# Altium schematic symbol library TI - ADC.SchLib: 2197 symbols (part 55 of 130) (continued)
## ADS7842E (continued)

## ADS7842E/1K
designator U?
12-Bit, 4-Channel Parallel Output Sampling ADC, -40 to 85 degC, 28-pin SOP (DB28), Green (RoHS & no Sb/Br); Manufacturer: Texas Instruments; PartNumber: ADS7842E/1K; # Input Channels: 4; Analog Voltage AV/DD(Max)(V): 5.25; Analog Voltage AV/DD(Min)(V): 2.7; Architecture: SAR; INL(Max)(+/-LSB): 2; Interface: Parallel CMOS; Resolution(Bits): 12; Sample Rate (max)(SPS): 200k; SFDR(dB): 79; SINAD(dB): 71; SNR(dB): 72; SubFamily: Precision ADC (<=10MSPS); DatasheetVersion: SBAS103C; PackageVersion: 4040065/E, 12/2001; PackageReference: DB28; PackageDescription: 28-Pin Plastic Small Outline, Body 10.2 X 5.3 mm, Pitch 0.65 mm; Supplier 1: Digi-Key; Supplier Part Number 1: 296-2204-5-ND; Supplier 2: Newark; Supplier Part Number 2: 19C9007; Supplier 3: Mouser; Supplier Part Number 3: 595-TLV2548CDW; Digital Supply(Max)(V): 5.25; Digital Supply(Min)(V): 2.7; Eco-Plan: Green (RoHS & no Sb/Br); Mounting Technology: Surface Mount; Code_JEDEC: MO-150; ComponentLink1Description: Manufacturer URL; ComponentLink1URL: http://www.ti.com/; ComponentLink2Description: Datasheet; ComponentLink2URL: http://www.ti.com/general/docs/lit/getliterature.tsp?genericPartNumber=ADS7842&fileType=pdf; ComponentLink3Description: Package Specification; ComponentLink3URL: http://www.ti.com/lit/ml/msso002e/msso002e.pdf
footprint TI-DB28_N (SOP, 28-Leads, Body 10.2x5.3mm, Pitch 0.65mm, IPC Medium Density)
footprint TI-DB28_L (SOP, 28-Leads, Body 10.2x5.3mm, Pitch 0.65mm, IPC High Density)
footprint TI-DB28_M (SOP, 28-Leads, Body 10.2x5.3mm, Pitch 0.65mm, IPC Low Density)
pins: 1 AIN0 (in) "Analog Input Channel 0", 2 AIN1 (in) "Analog Input Channel 1", 3 AIN2 (in) "Analog Input Channel 2", 4 AIN3 (in) "Analog Input Channel 3", 5 VREF (in) "Voltage Reference Input. See Electrical Characteristics Tables for ranges.", 6 AGND (power) "Analog Ground", 7 DB11 (hiz) "Data Bit 11 (MSB)", 8 DB10 (hiz) "Data Bit 10", 9 DB9 (hiz) "Data Bit 9", 10 DB8 (hiz) "Data Bit 8", 11 DB7 (hiz) "Data Bit 7", 12 DB6 (hiz) "Data Bit 6", 13 DB5 (hiz) "Data Bit 5", 14 DGND (power) "Digital Ground", 15 DB4 (hiz) "Data Bit 4", 16 DB3 (hiz) "Data Bit 3", 17 DB2 (hiz) "Data Bit 2", 18 DB1 (hiz) "Data Bit 1", 19 DB0 (hiz) "Data Bit 0 (LSB)", 20 ~{RD} (in) "Read Input. Active LOW. Reads the data outputs in combination with C\S\.", 21 ~{CS} (in) "Chip Select Input. Active LOW. The combination of C\S\ taken LOW and W\R\ taken LOW initiates a new conversion and places the outputs in the tri-state mode.", 22 ~{WR} (in) "Write Input. Active LOW. Starts a new conversion and selects an analog channel via address inputs A0 and A1, in combination with C\S\.", 23 ~{BUSY} (out) "B\U\S\Y\ goes LOW and stays LOW during a conversion. B\U\S\Y\ rises when a conversion is complete and enables the parallel outputs.", 24 CLK (in) "External Clock Input. The clock speed determines the conversion rate by the equation fCLK = 16 • fSAMPLE.", 25 A0 (in) "Address Inputs. Selects one of four analog input channels in combination with C\S\ and W\R\. The address inputs are latched on the rising edge of either R\D\ or W\R\.", 26 A1 (in) "Address Inputs. Selects one of four analog input channels in combination with C\S\ and W\R\. The address inputs are latched on the rising edge of either R\D\ or W\R\.", 27 VDIG (power) "Digital Supply Input. Nominally +5V.", 28 VANA (power) "Analog Supply Input. Nominally +5V."

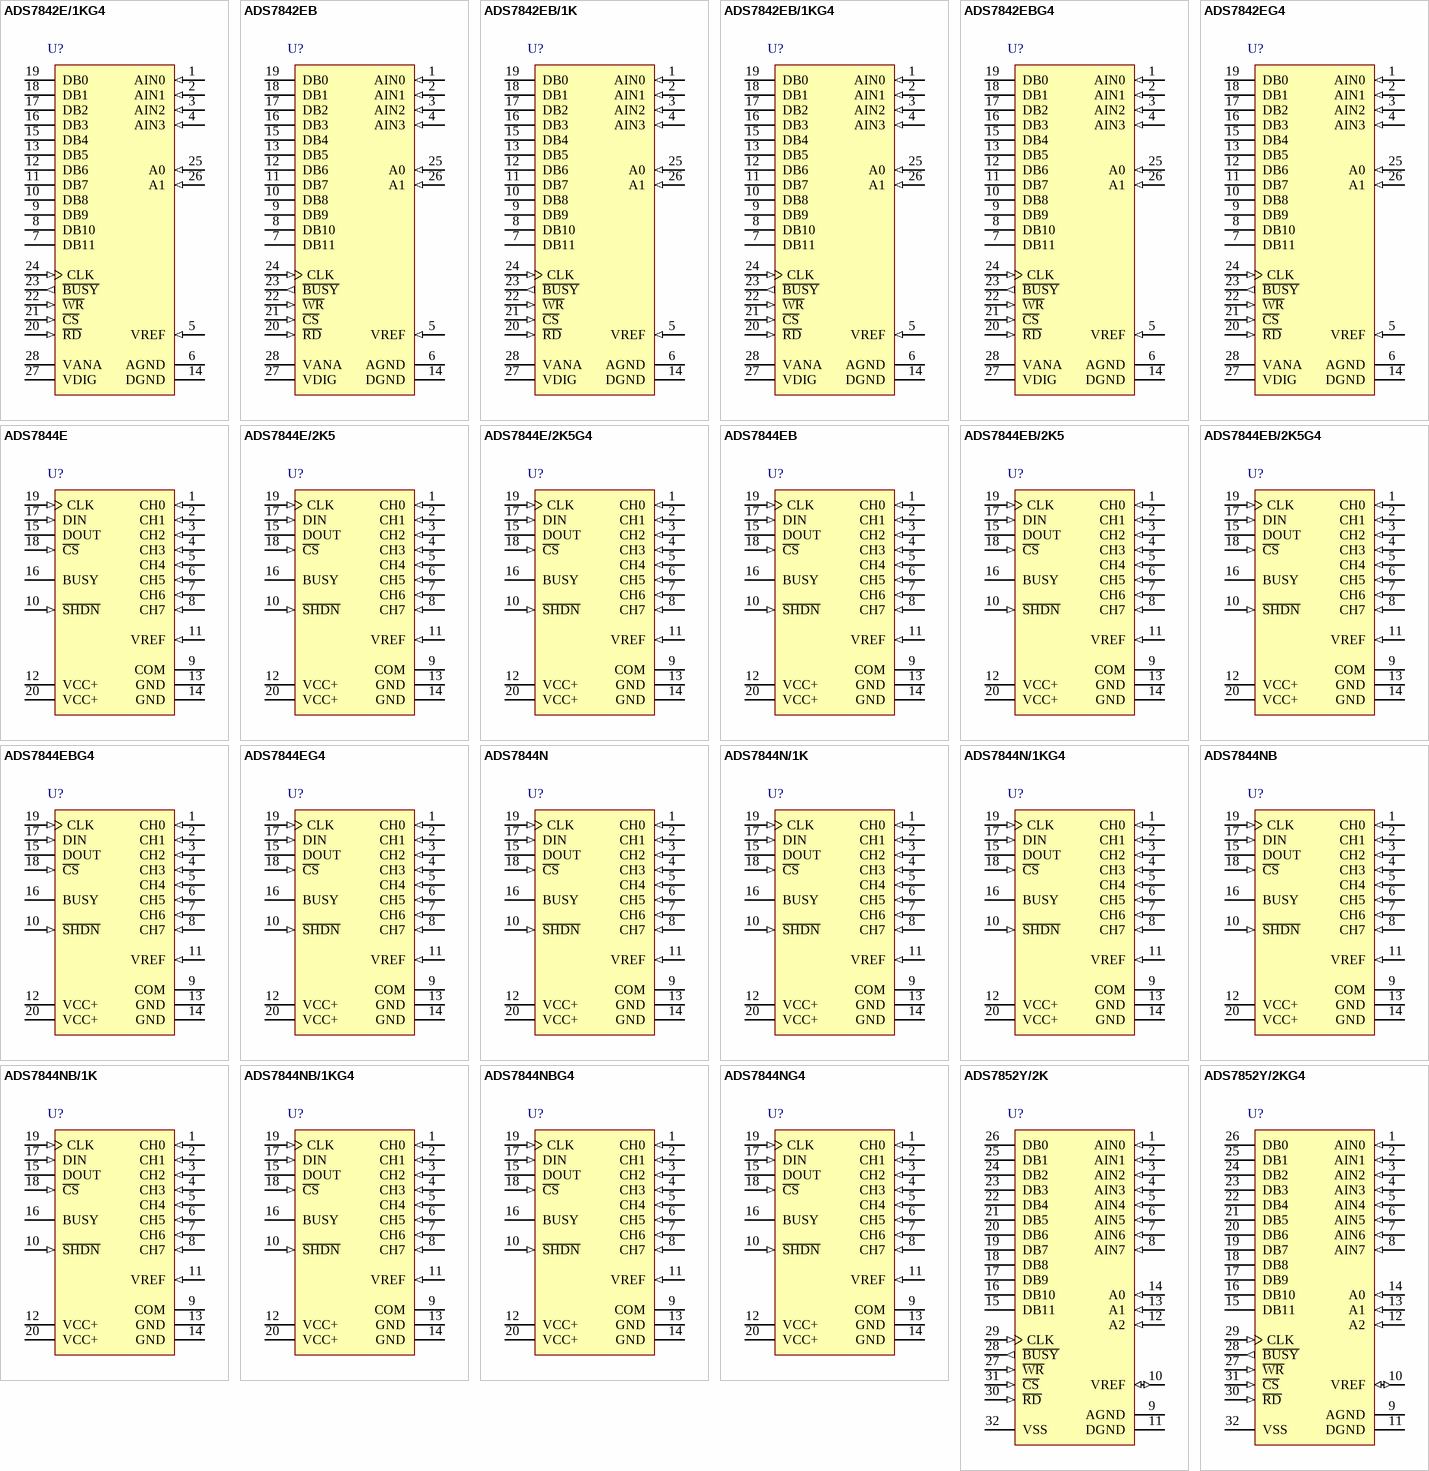
[diagram p65: symbols ADS7842E/1KG4 to ADS7852Y/2KG4]

## ADS7842E/1KG4
designator U?
12-Bit, 4-Channel Parallel Output Sampling ADC, -40 to 85 degC, 28-pin SOP (DB28), Green (RoHS & no Sb/Br); Manufacturer: Texas Instruments; PartNumber: ADS7842E/1KG4; # Input Channels: 4; Analog Voltage AV/DD(Max)(V): 5.25; Analog Voltage AV/DD(Min)(V): 2.7; Architecture: SAR; INL(Max)(+/-LSB): 2; Interface: Parallel CMOS; Resolution(Bits): 12; Sample Rate (max)(SPS): 200k; SFDR(dB): 79; SINAD(dB): 71; SNR(dB): 72; SubFamily: Precision ADC (<=10MSPS); DatasheetVersion: SBAS103C; PackageVersion: 4040065/E, 12/2001; PackageReference: DB28; PackageDescription: 28-Pin Plastic Small Outline, Body 10.2 X 5.3 mm, Pitch 0.65 mm; Supplier 1: Digi-Key; Supplier Part Number 1: TLV2548CDWG4-ND; Supplier 2: Mouser; Supplier Part Number 2: 595-TLV2548CDWG4; Digital Supply(Max)(V): 5.25; Digital Supply(Min)(V): 2.7; Eco-Plan: Green (RoHS & no Sb/Br); Mounting Technology: Surface Mount; Code_JEDEC: MO-150; ComponentLink1Description: Manufacturer URL; ComponentLink1URL: http://www.ti.com/; ComponentLink2Description: Datasheet; ComponentLink2URL: http://www.ti.com/general/docs/lit/getliterature.tsp?genericPartNumber=ADS7842&fileType=pdf; ComponentLink3Description: Package Specification; ComponentLink3URL: http://www.ti.com/lit/ml/msso002e/msso002e.pdf
footprint TI-DB28_N (SOP, 28-Leads, Body 10.2x5.3mm, Pitch 0.65mm, IPC Medium Density)
footprint TI-DB28_L (SOP, 28-Leads, Body 10.2x5.3mm, Pitch 0.65mm, IPC High Density)
footprint TI-DB28_M (SOP, 28-Leads, Body 10.2x5.3mm, Pitch 0.65mm, IPC Low Density)
pins: 1 AIN0 (in) "Analog Input Channel 0", 2 AIN1 (in) "Analog Input Channel 1", 3 AIN2 (in) "Analog Input Channel 2", 4 AIN3 (in) "Analog Input Channel 3", 5 VREF (in) "Voltage Reference Input. See Electrical Characteristics Tables for ranges.", 6 AGND (power) "Analog Ground", 7 DB11 (hiz) "Data Bit 11 (MSB)", 8 DB10 (hiz) "Data Bit 10", 9 DB9 (hiz) "Data Bit 9", 10 DB8 (hiz) "Data Bit 8", 11 DB7 (hiz) "Data Bit 7", 12 DB6 (hiz) "Data Bit 6", 13 DB5 (hiz) "Data Bit 5", 14 DGND (power) "Digital Ground", 15 DB4 (hiz) "Data Bit 4", 16 DB3 (hiz) "Data Bit 3", 17 DB2 (hiz) "Data Bit 2", 18 DB1 (hiz) "Data Bit 1", 19 DB0 (hiz) "Data Bit 0 (LSB)", 20 ~{RD} (in) "Read Input. Active LOW. Reads the data outputs in combination with C\S\.", 21 ~{CS} (in) "Chip Select Input. Active LOW. The combination of C\S\ taken LOW and W\R\ taken LOW initiates a new conversion and places the outputs in the tri-state mode.", 22 ~{WR} (in) "Write Input. Active LOW. Starts a new conversion and selects an analog channel via address inputs A0 and A1, in combination with C\S\.", 23 ~{BUSY} (out) "B\U\S\Y\ goes LOW and stays LOW during a conversion. B\U\S\Y\ rises when a conversion is complete and enables the parallel outputs.", 24 CLK (in) "External Clock Input. The clock speed determines the conversion rate by the equation fCLK = 16 • fSAMPLE.", 25 A0 (in) "Address Inputs. Selects one of four analog input channels in combination with C\S\ and W\R\. The address inputs are latched on the rising edge of either R\D\ or W\R\.", 26 A1 (in) "Address Inputs. Selects one of four analog input channels in combination with C\S\ and W\R\. The address inputs are latched on the rising edge of either R\D\ or W\R\.", 27 VDIG (power) "Digital Supply Input. Nominally +5V.", 28 VANA (power) "Analog Supply Input. Nominally +5V."

## ADS7842EB
designator U?
12-Bit, 4-Channel Parallel Output Sampling ADC, -40 to 85 degC, 28-pin SOP (DB28), Green (RoHS & no Sb/Br); Manufacturer: Texas Instruments; PartNumber: ADS7842EB; # Input Channels: 4; Analog Voltage AV/DD(Max)(V): 5.25; Analog Voltage AV/DD(Min)(V): 2.7; Architecture: SAR; INL(Max)(+/-LSB): 1; Interface: Parallel CMOS; Resolution(Bits): 12; Sample Rate (max)(SPS): 200k; SFDR(dB): 81; SINAD(dB): 72; SubFamily: Precision ADC (<=10MSPS); DatasheetVersion: SBAS103C; PackageVersion: 4040065/E, 12/2001; PackageReference: DB28; PackageDescription: 28-Pin Plastic Small Outline, Body 10.2 X 5.3 mm, Pitch 0.65 mm; Supplier 1: Digi-Key; Supplier Part Number 1: TLV2548CDWR-ND; Supplier 2: Mouser; Supplier Part Number 2: 595-TLV2548CDWR; Digital Supply(Max)(V): 5.25; Digital Supply(Min)(V): 2.7; Eco-Plan: Green (RoHS & no Sb/Br); SNR(dB): 72; Mounting Technology: Surface Mount; Code_JEDEC: MO-150; ComponentLink1Description: Manufacturer URL; ComponentLink1URL: http://www.ti.com/; ComponentLink2Description: Datasheet; ComponentLink2URL: http://www.ti.com/general/docs/lit/getliterature.tsp?genericPartNumber=ADS7842&fileType=pdf; ComponentLink3Description: Package Specification; ComponentLink3URL: http://www.ti.com/lit/ml/msso002e/msso002e.pdf
footprint TI-DB28_N (SOP, 28-Leads, Body 10.2x5.3mm, Pitch 0.65mm, IPC Medium Density)
footprint TI-DB28_L (SOP, 28-Leads, Body 10.2x5.3mm, Pitch 0.65mm, IPC High Density)
footprint TI-DB28_M (SOP, 28-Leads, Body 10.2x5.3mm, Pitch 0.65mm, IPC Low Density)
pins: 1 AIN0 (in) "Analog Input Channel 0", 2 AIN1 (in) "Analog Input Channel 1", 3 AIN2 (in) "Analog Input Channel 2", 4 AIN3 (in) "Analog Input Channel 3", 5 VREF (in) "Voltage Reference Input. See Electrical Characteristics Tables for ranges.", 6 AGND (power) "Analog Ground", 7 DB11 (hiz) "Data Bit 11 (MSB)", 8 DB10 (hiz) "Data Bit 10", 9 DB9 (hiz) "Data Bit 9", 10 DB8 (hiz) "Data Bit 8", 11 DB7 (hiz) "Data Bit 7", 12 DB6 (hiz) "Data Bit 6", 13 DB5 (hiz) "Data Bit 5", 14 DGND (power) "Digital Ground", 15 DB4 (hiz) "Data Bit 4", 16 DB3 (hiz) "Data Bit 3", 17 DB2 (hiz) "Data Bit 2", 18 DB1 (hiz) "Data Bit 1", 19 DB0 (hiz) "Data Bit 0 (LSB)", 20 ~{RD} (in) "Read Input. Active LOW. Reads the data outputs in combination with C\S\.", 21 ~{CS} (in) "Chip Select Input. Active LOW. The combination of C\S\ taken LOW and W\R\ taken LOW initiates a new conversion and places the outputs in the tri-state mode.", 22 ~{WR} (in) "Write Input. Active LOW. Starts a new conversion and selects an analog channel via address inputs A0 and A1, in combination with C\S\.", 23 ~{BUSY} (out) "B\U\S\Y\ goes LOW and stays LOW during a conversion. B\U\S\Y\ rises when a conversion is complete and enables the parallel outputs.", 24 CLK (in) "External Clock Input. The clock speed determines the conversion rate by the equation fCLK = 16 • fSAMPLE.", 25 A0 (in) "Address Inputs. Selects one of four analog input channels in combination with C\S\ and W\R\. The address inputs are latched on the rising edge of either R\D\ or W\R\.", 26 A1 (in) "Address Inputs. Selects one of four analog input channels in combination with C\S\ and W\R\. The address inputs are latched on the rising edge of either R\D\ or W\R\.", 27 VDIG (power) "Digital Supply Input. Nominally +5V.", 28 VANA (power) "Analog Supply Input. Nominally +5V."

## ADS7842EB/1K
designator U?
12-Bit, 4-Channel Parallel Output Sampling ADC, -40 to 85 degC, 28-pin SOP (DB28), Green (RoHS & no Sb/Br); Manufacturer: Texas Instruments; PartNumber: ADS7842EB/1K; # Input Channels: 4; Analog Voltage AV/DD(Max)(V): 5.25; Analog Voltage AV/DD(Min)(V): 2.7; Architecture: SAR; INL(Max)(+/-LSB): 1; Interface: Parallel CMOS; Resolution(Bits): 12; Sample Rate (max)(SPS): 200k; SFDR(dB): 81; SINAD(dB): 72; SubFamily: Precision ADC (<=10MSPS); DatasheetVersion: SBAS103C; PackageVersion: 4040065/E, 12/2001; PackageReference: DB28; PackageDescription: 28-Pin Plastic Small Outline, Body 10.2 X 5.3 mm, Pitch 0.65 mm; Supplier 1: Digi-Key; Supplier Part Number 1: TLV2548CDWRG4-ND; Supplier 2: Mouser; Supplier Part Number 2: 595-TLV2548CDWRG4; Digital Supply(Max)(V): 5.25; Digital Supply(Min)(V): 2.7; Eco-Plan: Green (RoHS & no Sb/Br); SNR(dB): 72; Mounting Technology: Surface Mount; Code_JEDEC: MO-150; ComponentLink1Description: Manufacturer URL; ComponentLink1URL: http://www.ti.com/; ComponentLink2Description: Datasheet; ComponentLink2URL: http://www.ti.com/general/docs/lit/getliterature.tsp?genericPartNumber=ADS7842&fileType=pdf; ComponentLink3Description: Package Specification; ComponentLink3URL: http://www.ti.com/lit/ml/msso002e/msso002e.pdf
footprint TI-DB28_N (SOP, 28-Leads, Body 10.2x5.3mm, Pitch 0.65mm, IPC Medium Density)
footprint TI-DB28_L (SOP, 28-Leads, Body 10.2x5.3mm, Pitch 0.65mm, IPC High Density)
footprint TI-DB28_M (SOP, 28-Leads, Body 10.2x5.3mm, Pitch 0.65mm, IPC Low Density)
pins: 1 AIN0 (in) "Analog Input Channel 0", 2 AIN1 (in) "Analog Input Channel 1", 3 AIN2 (in) "Analog Input Channel 2", 4 AIN3 (in) "Analog Input Channel 3", 5 VREF (in) "Voltage Reference Input. See Electrical Characteristics Tables for ranges.", 6 AGND (power) "Analog Ground", 7 DB11 (hiz) "Data Bit 11 (MSB)", 8 DB10 (hiz) "Data Bit 10", 9 DB9 (hiz) "Data Bit 9", 10 DB8 (hiz) "Data Bit 8", 11 DB7 (hiz) "Data Bit 7", 12 DB6 (hiz) "Data Bit 6", 13 DB5 (hiz) "Data Bit 5", 14 DGND (power) "Digital Ground", 15 DB4 (hiz) "Data Bit 4", 16 DB3 (hiz) "Data Bit 3", 17 DB2 (hiz) "Data Bit 2", 18 DB1 (hiz) "Data Bit 1", 19 DB0 (hiz) "Data Bit 0 (LSB)", 20 ~{RD} (in) "Read Input. Active LOW. Reads the data outputs in combination with C\S\.", 21 ~{CS} (in) "Chip Select Input. Active LOW. The combination of C\S\ taken LOW and W\R\ taken LOW initiates a new conversion and places the outputs in the tri-state mode.", 22 ~{WR} (in) "Write Input. Active LOW. Starts a new conversion and selects an analog channel via address inputs A0 and A1, in combination with C\S\.", 23 ~{BUSY} (out) "B\U\S\Y\ goes LOW and stays LOW during a conversion. B\U\S\Y\ rises when a conversion is complete and enables the parallel outputs.", 24 CLK (in) "External Clock Input. The clock speed determines the conversion rate by the equation fCLK = 16 • fSAMPLE.", 25 A0 (in) "Address Inputs. Selects one of four analog input channels in combination with C\S\ and W\R\. The address inputs are latched on the rising edge of either R\D\ or W\R\.", 26 A1 (in) "Address Inputs. Selects one of four analog input channels in combination with C\S\ and W\R\. The address inputs are latched on the rising edge of either R\D\ or W\R\.", 27 VDIG (power) "Digital Supply Input. Nominally +5V.", 28 VANA (power) "Analog Supply Input. Nominally +5V."

## ADS7842EB/1KG4
designator U?
12-Bit, 4-Channel Parallel Output Sampling ADC, -40 to 85 degC, 28-pin SOP (DB28), Green (RoHS & no Sb/Br); Manufacturer: Texas Instruments; PartNumber: ADS7842EB/1KG4; # Input Channels: 4; Analog Voltage AV/DD(Max)(V): 5.25; Analog Voltage AV/DD(Min)(V): 2.7; Architecture: SAR; INL(Max)(+/-LSB): 1; Interface: Parallel CMOS; Resolution(Bits): 12; Sample Rate (max)(SPS): 200k; SFDR(dB): 81; SINAD(dB): 72; SubFamily: Precision ADC (<=10MSPS); DatasheetVersion: SBAS103C; PackageVersion: 4040065/E, 12/2001; PackageReference: DB28; PackageDescription: 28-Pin Plastic Small Outline, Body 10.2 X 5.3 mm, Pitch 0.65 mm; Supplier 1: Digi-Key; Supplier Part Number 1: TLV2548CPW-ND; Supplier 2: Newark; Supplier Part Number 2: 76C8369; Supplier 3: Mouser; Supplier Part Number 3: 595-TLV2548CPW; Digital Supply(Max)(V): 5.25; Digital Supply(Min)(V): 2.7; Eco-Plan: Green (RoHS & no Sb/Br); SNR(dB): 72; Mounting Technology: Surface Mount; Code_JEDEC: MO-150; ComponentLink1Description: Manufacturer URL; ComponentLink1URL: http://www.ti.com/; ComponentLink2Description: Datasheet; ComponentLink2URL: http://www.ti.com/general/docs/lit/getliterature.tsp?genericPartNumber=ADS7842&fileType=pdf; ComponentLink3Description: Package Specification; ComponentLink3URL: http://www.ti.com/lit/ml/msso002e/msso002e.pdf
footprint TI-DB28_N (SOP, 28-Leads, Body 10.2x5.3mm, Pitch 0.65mm, IPC Medium Density)
footprint TI-DB28_L (SOP, 28-Leads, Body 10.2x5.3mm, Pitch 0.65mm, IPC High Density)
footprint TI-DB28_M (SOP, 28-Leads, Body 10.2x5.3mm, Pitch 0.65mm, IPC Low Density)
pins: 1 AIN0 (in) "Analog Input Channel 0", 2 AIN1 (in) "Analog Input Channel 1", 3 AIN2 (in) "Analog Input Channel 2", 4 AIN3 (in) "Analog Input Channel 3", 5 VREF (in) "Voltage Reference Input. See Electrical Characteristics Tables for ranges.", 6 AGND (power) "Analog Ground", 7 DB11 (hiz) "Data Bit 11 (MSB)", 8 DB10 (hiz) "Data Bit 10", 9 DB9 (hiz) "Data Bit 9", 10 DB8 (hiz) "Data Bit 8", 11 DB7 (hiz) "Data Bit 7", 12 DB6 (hiz) "Data Bit 6", 13 DB5 (hiz) "Data Bit 5", 14 DGND (power) "Digital Ground", 15 DB4 (hiz) "Data Bit 4", 16 DB3 (hiz) "Data Bit 3", 17 DB2 (hiz) "Data Bit 2", 18 DB1 (hiz) "Data Bit 1", 19 DB0 (hiz) "Data Bit 0 (LSB)", 20 ~{RD} (in) "Read Input. Active LOW. Reads the data outputs in combination with C\S\.", 21 ~{CS} (in) "Chip Select Input. Active LOW. The combination of C\S\ taken LOW and W\R\ taken LOW initiates a new conversion and places the outputs in the tri-state mode.", 22 ~{WR} (in) "Write Input. Active LOW. Starts a new conversion and selects an analog channel via address inputs A0 and A1, in combination with C\S\.", 23 ~{BUSY} (out) "B\U\S\Y\ goes LOW and stays LOW during a conversion. B\U\S\Y\ rises when a conversion is complete and enables the parallel outputs.", 24 CLK (in) "External Clock Input. The clock speed determines the conversion rate by the equation fCLK = 16 • fSAMPLE.", 25 A0 (in) "Address Inputs. Selects one of four analog input channels in combination with C\S\ and W\R\. The address inputs are latched on the rising edge of either R\D\ or W\R\.", 26 A1 (in) "Address Inputs. Selects one of four analog input channels in combination with C\S\ and W\R\. The address inputs are latched on the rising edge of either R\D\ or W\R\.", 27 VDIG (power) "Digital Supply Input. Nominally +5V.", 28 VANA (power) "Analog Supply Input. Nominally +5V."

## ADS7842EBG4
designator U?
12-Bit, 4-Channel Parallel Output Sampling ADC, -40 to 85 degC, 28-pin SOP (DB28), Green (RoHS & no Sb/Br); Manufacturer: Texas Instruments; PartNumber: ADS7842EBG4; # Input Channels: 4; Analog Voltage AV/DD(Max)(V): 5.25; Analog Voltage AV/DD(Min)(V): 2.7; Architecture: SAR; INL(Max)(+/-LSB): 1; Interface: Parallel CMOS; Resolution(Bits): 12; Sample Rate (max)(SPS): 200k; SFDR(dB): 81; SINAD(dB): 72; SubFamily: Precision ADC (<=10MSPS); DatasheetVersion: SBAS103C; PackageVersion: 4040065/E, 12/2001; PackageReference: DB28; PackageDescription: 28-Pin Plastic Small Outline, Body 10.2 X 5.3 mm, Pitch 0.65 mm; Supplier 1: Digi-Key; Supplier Part Number 1: TLV2548CPWG4-ND; Supplier 2: Mouser; Supplier Part Number 2: 595-TLV2548CPWG4; Digital Supply(Max)(V): 5.25; Digital Supply(Min)(V): 2.7; Eco-Plan: Green (RoHS & no Sb/Br); SNR(dB): 72; Mounting Technology: Surface Mount; Code_JEDEC: MO-150; ComponentLink1Description: Manufacturer URL; ComponentLink1URL: http://www.ti.com/; ComponentLink2Description: Datasheet; ComponentLink2URL: http://www.ti.com/general/docs/lit/getliterature.tsp?genericPartNumber=ADS7842&fileType=pdf; ComponentLink3Description: Package Specification; ComponentLink3URL: http://www.ti.com/lit/ml/msso002e/msso002e.pdf
footprint TI-DB28_N (SOP, 28-Leads, Body 10.2x5.3mm, Pitch 0.65mm, IPC Medium Density)
footprint TI-DB28_L (SOP, 28-Leads, Body 10.2x5.3mm, Pitch 0.65mm, IPC High Density)
footprint TI-DB28_M (SOP, 28-Leads, Body 10.2x5.3mm, Pitch 0.65mm, IPC Low Density)
pins: 1 AIN0 (in) "Analog Input Channel 0", 2 AIN1 (in) "Analog Input Channel 1", 3 AIN2 (in) "Analog Input Channel 2", 4 AIN3 (in) "Analog Input Channel 3", 5 VREF (in) "Voltage Reference Input. See Electrical Characteristics Tables for ranges.", 6 AGND (power) "Analog Ground", 7 DB11 (hiz) "Data Bit 11 (MSB)", 8 DB10 (hiz) "Data Bit 10", 9 DB9 (hiz) "Data Bit 9", 10 DB8 (hiz) "Data Bit 8", 11 DB7 (hiz) "Data Bit 7", 12 DB6 (hiz) "Data Bit 6", 13 DB5 (hiz) "Data Bit 5", 14 DGND (power) "Digital Ground", 15 DB4 (hiz) "Data Bit 4", 16 DB3 (hiz) "Data Bit 3", 17 DB2 (hiz) "Data Bit 2", 18 DB1 (hiz) "Data Bit 1", 19 DB0 (hiz) "Data Bit 0 (LSB)", 20 ~{RD} (in) "Read Input. Active LOW. Reads the data outputs in combination with C\S\.", 21 ~{CS} (in) "Chip Select Input. Active LOW. The combination of C\S\ taken LOW and W\R\ taken LOW initiates a new conversion and places the outputs in the tri-state mode.", 22 ~{WR} (in) "Write Input. Active LOW. Starts a new conversion and selects an analog channel via address inputs A0 and A1, in combination with C\S\.", 23 ~{BUSY} (out) "B\U\S\Y\ goes LOW and stays LOW during a conversion. B\U\S\Y\ rises when a conversion is complete and enables the parallel outputs.", 24 CLK (in) "External Clock Input. The clock speed determines the conversion rate by the equation fCLK = 16 • fSAMPLE.", 25 A0 (in) "Address Inputs. Selects one of four analog input channels in combination with C\S\ and W\R\. The address inputs are latched on the rising edge of either R\D\ or W\R\.", 26 A1 (in) "Address Inputs. Selects one of four analog input channels in combination with C\S\ and W\R\. The address inputs are latched on the rising edge of either R\D\ or W\R\.", 27 VDIG (power) "Digital Supply Input. Nominally +5V.", 28 VANA (power) "Analog Supply Input. Nominally +5V."

## ADS7842EG4
designator U?
12-Bit, 4-Channel Parallel Output Sampling ADC, -40 to 85 degC, 28-pin SOP (DB28), Green (RoHS & no Sb/Br); Manufacturer: Texas Instruments; PartNumber: ADS7842EG4; # Input Channels: 4; Analog Voltage AV/DD(Max)(V): 5.25; Analog Voltage AV/DD(Min)(V): 2.7; Architecture: SAR; INL(Max)(+/-LSB): 2; Interface: Parallel CMOS; Resolution(Bits): 12; Sample Rate (max)(SPS): 200k; SFDR(dB): 79; SINAD(dB): 71; SNR(dB): 72; SubFamily: Precision ADC (<=10MSPS); DatasheetVersion: SBAS103C; PackageVersion: 4040065/E, 12/2001; PackageReference: DB28; PackageDescription: 28-Pin Plastic Small Outline, Body 10.2 X 5.3 mm, Pitch 0.65 mm; Supplier 1: Digi-Key; Supplier Part Number 1: TLV2548CPWR-ND; Supplier 2: Mouser; Supplier Part Number 2: 595-TLV2548CPWR; Digital Supply(Max)(V): 5.25; Digital Supply(Min)(V): 2.7; Eco-Plan: Green (RoHS & no Sb/Br); Mounting Technology: Surface Mount; Code_JEDEC: MO-150; ComponentLink1Description: Manufacturer URL; ComponentLink1URL: http://www.ti.com/; ComponentLink2Description: Datasheet; ComponentLink2URL: http://www.ti.com/general/docs/lit/getliterature.tsp?genericPartNumber=ADS7842&fileType=pdf; ComponentLink3Description: Package Specification; ComponentLink3URL: http://www.ti.com/lit/ml/msso002e/msso002e.pdf
footprint TI-DB28_N (SOP, 28-Leads, Body 10.2x5.3mm, Pitch 0.65mm, IPC Medium Density)
footprint TI-DB28_L (SOP, 28-Leads, Body 10.2x5.3mm, Pitch 0.65mm, IPC High Density)
footprint TI-DB28_M (SOP, 28-Leads, Body 10.2x5.3mm, Pitch 0.65mm, IPC Low Density)
pins: 1 AIN0 (in) "Analog Input Channel 0", 2 AIN1 (in) "Analog Input Channel 1", 3 AIN2 (in) "Analog Input Channel 2", 4 AIN3 (in) "Analog Input Channel 3", 5 VREF (in) "Voltage Reference Input. See Electrical Characteristics Tables for ranges.", 6 AGND (power) "Analog Ground", 7 DB11 (hiz) "Data Bit 11 (MSB)", 8 DB10 (hiz) "Data Bit 10", 9 DB9 (hiz) "Data Bit 9", 10 DB8 (hiz) "Data Bit 8", 11 DB7 (hiz) "Data Bit 7", 12 DB6 (hiz) "Data Bit 6", 13 DB5 (hiz) "Data Bit 5", 14 DGND (power) "Digital Ground", 15 DB4 (hiz) "Data Bit 4", 16 DB3 (hiz) "Data Bit 3", 17 DB2 (hiz) "Data Bit 2", 18 DB1 (hiz) "Data Bit 1", 19 DB0 (hiz) "Data Bit 0 (LSB)", 20 ~{RD} (in) "Read Input. Active LOW. Reads the data outputs in combination with C\S\.", 21 ~{CS} (in) "Chip Select Input. Active LOW. The combination of C\S\ taken LOW and W\R\ taken LOW initiates a new conversion and places the outputs in the tri-state mode.", 22 ~{WR} (in) "Write Input. Active LOW. Starts a new conversion and selects an analog channel via address inputs A0 and A1, in combination with C\S\.", 23 ~{BUSY} (out) "B\U\S\Y\ goes LOW and stays LOW during a conversion. B\U\S\Y\ rises when a conversion is complete and enables the parallel outputs.", 24 CLK (in) "External Clock Input. The clock speed determines the conversion rate by the equation fCLK = 16 • fSAMPLE.", 25 A0 (in) "Address Inputs. Selects one of four analog input channels in combination with C\S\ and W\R\. The address inputs are latched on the rising edge of either R\D\ or W\R\.", 26 A1 (in) "Address Inputs. Selects one of four analog input channels in combination with C\S\ and W\R\. The address inputs are latched on the rising edge of either R\D\ or W\R\.", 27 VDIG (power) "Digital Supply Input. Nominally +5V.", 28 VANA (power) "Analog Supply Input. Nominally +5V."

## ADS7844E
designator U?
12-Bit, 8-Channel Serial Output Sampling ADC, -40 to 85 degC, 20-pin SOP (DBQ20), Green (RoHS & no Sb/Br); Manufacturer: Texas Instruments; PartNumber: ADS7844E; # Input Channels: 8; Analog Voltage AV/DD(Max)(V): 5.25; Analog Voltage AV/DD(Min)(V): 2.7; Architecture: SAR; INL(Max)(+/-LSB): 2; Interface: Serial SPI; Resolution(Bits): 12; Sample Rate (max)(SPS): 200K; SFDR(dB): 76; SINAD(dB): 71; SNR(dB): 72; SubFamily: Precision ADC (<=10MSPS); DatasheetVersion: SBAS100A; PackageVersion: 4073301-3/H, 10/2008; PackageReference: DBQ20; PackageDescription: 20-Pin Plastic Small Outline, Body 8.65 x 3.9 mm, Pitch 0.635 mm; Supplier 1: Digi-Key; Supplier Part Number 1: TLV2548CPWRG4-ND; Supplier 2: Mouser; Supplier Part Number 2: 595-TLV2548CPWRG4; Digital Supply(Max)(V): 5.25; Digital Supply(Min)(V): 2.7; Eco-Plan: Green (RoHS & no Sb/Br); Mounting Technology: Surface Mount; Code_JEDEC: MO-137; ComponentLink1Description: Manufacturer URL; ComponentLink1URL: http://www.ti.com/; ComponentLink2Description: Datasheet; ComponentLink2URL: http://www.ti.com/general/docs/lit/getliterature.tsp?genericPartNumber=ADS7844&fileType=pdf; ComponentLink3Description: Package Specification; ComponentLink3URL: http://www.ti.com/litv/pdf/mpds210a
footprint TI-DBQ20_N (SOP, 20-Leads, Body 8.65x3.9mm, Pitch 0.635mm, IPC Medium Density)
footprint TI-DBQ20_L (SOP, 20-Leads, Body 8.65x3.9mm, Pitch 0.635mm, IPC High Density)
footprint TI-DBQ20_M (SOP, 20-Leads, Body 8.65x3.9mm, Pitch 0.635mm, IPC Low Density)
pins: 1 CH0 (in) "Analog Input Channel 0.", 2 CH1 (in) "Analog Input Channel 1.", 3 CH2 (in) "Analog Input Channel 2.", 4 CH3 (in) "Analog Input Channel 3.", 5 CH4 (in) "Analog Input Channel 4.", 6 CH5 (in) "Analog Input Channel 5.", 7 CH6 (in) "Analog Input Channel 6.", 8 CH7 (in) "Analog Input Channel 7.", 9 COM (power) "Ground reference for analog inputs. Sets zero code voltage in single ended mode. Connect this pin to ground or ground reference point.", 10 ~{SHDN} (in) "Shutdown. When LOW, the device enters a very low power shutdown mode.", 11 VREF (in) "Voltage Reference Input. See Specification Table for ranges.", 12 VCC+ (power) "Power Supply, 2.7V to 5V.", 13 GND (power) "Ground", 14 GND (power) "Ground", 15 DOUT (hiz) "Serial Data Output. Data is shifted on the falling edge of DCLK. This output is high impedance when C\S\ is high.", 16 BUSY (hiz) "Busy Output. Busy goes low when the DIN control bits are being read and also when the device is converting. The Output is high impedance when C\S\ is High.", 17 DIN (in) "Serial Data Input. If C\S\ is LOW, data is latched on rising edge of DCLK.", 18 ~{CS} (in) "Chip Select Input. Active LOW. Data will not be clocked into DIN unless C\S\ is low. When C\S\ is high DOUT is high impedance", 19 CLK (in) "External Clock Input. The clock speed determines the conversion rate by the equation fCLK = 16 x fSAMPLE.", 20 VCC+ (power) "Power Supply"

## ADS7844E/2K5
designator U?
12-Bit, 8-Channel Serial Output Sampling ADC, -40 to 85 degC, 20-pin SOP (DBQ20), Green (RoHS & no Sb/Br); Manufacturer: Texas Instruments; PartNumber: ADS7844E/2K5; # Input Channels: 8; Analog Voltage AV/DD(Max)(V): 5.25; Analog Voltage AV/DD(Min)(V): 2.7; Architecture: SAR; INL(Max)(+/-LSB): 2; Interface: Serial SPI; Resolution(Bits): 12; Sample Rate (max)(SPS): 200K; SFDR(dB): 76; SINAD(dB): 71; SNR(dB): 72; SubFamily: Precision ADC (<=10MSPS); DatasheetVersion: SBAS100A; PackageVersion: 4073301-3/H, 10/2008; PackageReference: DBQ20; PackageDescription: 20-Pin Plastic Small Outline, Body 8.65 x 3.9 mm, Pitch 0.635 mm; Supplier 1: Digi-Key; Supplier Part Number 1: 296-2986-5-ND; Supplier 2: Newark; Supplier Part Number 2: 19C9008; Supplier 3: Mouser; Supplier Part Number 3: 595-TLV2548IDW; Digital Supply(Max)(V): 5.25; Digital Supply(Min)(V): 2.7; Eco-Plan: Green (RoHS & no Sb/Br); Mounting Technology: Surface Mount; Code_JEDEC: MO-137; ComponentLink1Description: Manufacturer URL; ComponentLink1URL: http://www.ti.com/; ComponentLink2Description: Datasheet; ComponentLink2URL: http://www.ti.com/general/docs/lit/getliterature.tsp?genericPartNumber=ADS7844&fileType=pdf; ComponentLink3Description: Package Specification; ComponentLink3URL: http://www.ti.com/litv/pdf/mpds210a
footprint TI-DBQ20_N (SOP, 20-Leads, Body 8.65x3.9mm, Pitch 0.635mm, IPC Medium Density)
footprint TI-DBQ20_L (SOP, 20-Leads, Body 8.65x3.9mm, Pitch 0.635mm, IPC High Density)
footprint TI-DBQ20_M (SOP, 20-Leads, Body 8.65x3.9mm, Pitch 0.635mm, IPC Low Density)
pins: 1 CH0 (in) "Analog Input Channel 0.", 2 CH1 (in) "Analog Input Channel 1.", 3 CH2 (in) "Analog Input Channel 2.", 4 CH3 (in) "Analog Input Channel 3.", 5 CH4 (in) "Analog Input Channel 4.", 6 CH5 (in) "Analog Input Channel 5.", 7 CH6 (in) "Analog Input Channel 6.", 8 CH7 (in) "Analog Input Channel 7.", 9 COM (power) "Ground reference for analog inputs. Sets zero code voltage in single ended mode. Connect this pin to ground or ground reference point.", 10 ~{SHDN} (in) "Shutdown. When LOW, the device enters a very low power shutdown mode.", 11 VREF (in) "Voltage Reference Input. See Specification Table for ranges.", 12 VCC+ (power) "Power Supply, 2.7V to 5V.", 13 GND (power) "Ground", 14 GND (power) "Ground", 15 DOUT (hiz) "Serial Data Output. Data is shifted on the falling edge of DCLK. This output is high impedance when C\S\ is high.", 16 BUSY (hiz) "Busy Output. Busy goes low when the DIN control bits are being read and also when the device is converting. The Output is high impedance when C\S\ is High.", 17 DIN (in) "Serial Data Input. If C\S\ is LOW, data is latched on rising edge of DCLK.", 18 ~{CS} (in) "Chip Select Input. Active LOW. Data will not be clocked into DIN unless C\S\ is low. When C\S\ is high DOUT is high impedance", 19 CLK (in) "External Clock Input. The clock speed determines the conversion rate by the equation fCLK = 16 x fSAMPLE.", 20 VCC+ (power) "Power Supply"

## ADS7844E/2K5G4
designator U?
12-Bit, 8-Channel Serial Output Sampling ADC, -40 to 85 degC, 20-pin SOP (DBQ20), Green (RoHS & no Sb/Br); Manufacturer: Texas Instruments; PartNumber: ADS7844E/2K5G4; # Input Channels: 8; Analog Voltage AV/DD(Max)(V): 5.25; Analog Voltage AV/DD(Min)(V): 2.7; Architecture: SAR; INL(Max)(+/-LSB): 2; Interface: Serial SPI; Resolution(Bits): 12; Sample Rate (max)(SPS): 200K; SFDR(dB): 76; SINAD(dB): 71; SNR(dB): 72; SubFamily: Precision ADC (<=10MSPS); DatasheetVersion: SBAS100A; PackageVersion: 4073301-3/H, 10/2008; PackageReference: DBQ20; PackageDescription: 20-Pin Plastic Small Outline, Body 8.65 x 3.9 mm, Pitch 0.635 mm; Supplier 1: Digi-Key; Supplier Part Number 1: TLV2548IDWG4-ND; Supplier 2: Mouser; Supplier Part Number 2: 595-TLV2548IDWG4; Digital Supply(Max)(V): 5.25; Digital Supply(Min)(V): 2.7; Eco-Plan: Green (RoHS & no Sb/Br); Mounting Technology: Surface Mount; Code_JEDEC: MO-137; ComponentLink1Description: Manufacturer URL; ComponentLink1URL: http://www.ti.com/; ComponentLink2Description: Datasheet; ComponentLink2URL: http://www.ti.com/general/docs/lit/getliterature.tsp?genericPartNumber=ADS7844&fileType=pdf; ComponentLink3Description: Package Specification; ComponentLink3URL: http://www.ti.com/litv/pdf/mpds210a
footprint TI-DBQ20_N (SOP, 20-Leads, Body 8.65x3.9mm, Pitch 0.635mm, IPC Medium Density)
footprint TI-DBQ20_L (SOP, 20-Leads, Body 8.65x3.9mm, Pitch 0.635mm, IPC High Density)
footprint TI-DBQ20_M (SOP, 20-Leads, Body 8.65x3.9mm, Pitch 0.635mm, IPC Low Density)
pins: 1 CH0 (in) "Analog Input Channel 0.", 2 CH1 (in) "Analog Input Channel 1.", 3 CH2 (in) "Analog Input Channel 2.", 4 CH3 (in) "Analog Input Channel 3.", 5 CH4 (in) "Analog Input Channel 4.", 6 CH5 (in) "Analog Input Channel 5.", 7 CH6 (in) "Analog Input Channel 6.", 8 CH7 (in) "Analog Input Channel 7.", 9 COM (power) "Ground reference for analog inputs. Sets zero code voltage in single ended mode. Connect this pin to ground or ground reference point.", 10 ~{SHDN} (in) "Shutdown. When LOW, the device enters a very low power shutdown mode.", 11 VREF (in) "Voltage Reference Input. See Specification Table for ranges.", 12 VCC+ (power) "Power Supply, 2.7V to 5V.", 13 GND (power) "Ground", 14 GND (power) "Ground", 15 DOUT (hiz) "Serial Data Output. Data is shifted on the falling edge of DCLK. This output is high impedance when C\S\ is high.", 16 BUSY (hiz) "Busy Output. Busy goes low when the DIN control bits are being read and also when the device is converting. The Output is high impedance when C\S\ is High.", 17 DIN (in) "Serial Data Input. If C\S\ is LOW, data is latched on rising edge of DCLK.", 18 ~{CS} (in) "Chip Select Input. Active LOW. Data will not be clocked into DIN unless C\S\ is low. When C\S\ is high DOUT is high impedance", 19 CLK (in) "External Clock Input. The clock speed determines the conversion rate by the equation fCLK = 16 x fSAMPLE.", 20 VCC+ (power) "Power Supply"